# Altium footprint library CONNECTOR.PcbLib: 169 footprints (part 2 of 11)
Each footprint in its own frame and in the unit in brackets; x right, y up, seen from the top. Pads: shape width x height; smd on the part's side, far side on the other; paste and mask are expansions set on the pad; w line width, h text height; cw(c..) or ccw(c..) is an arc to the next point about the centre after c.
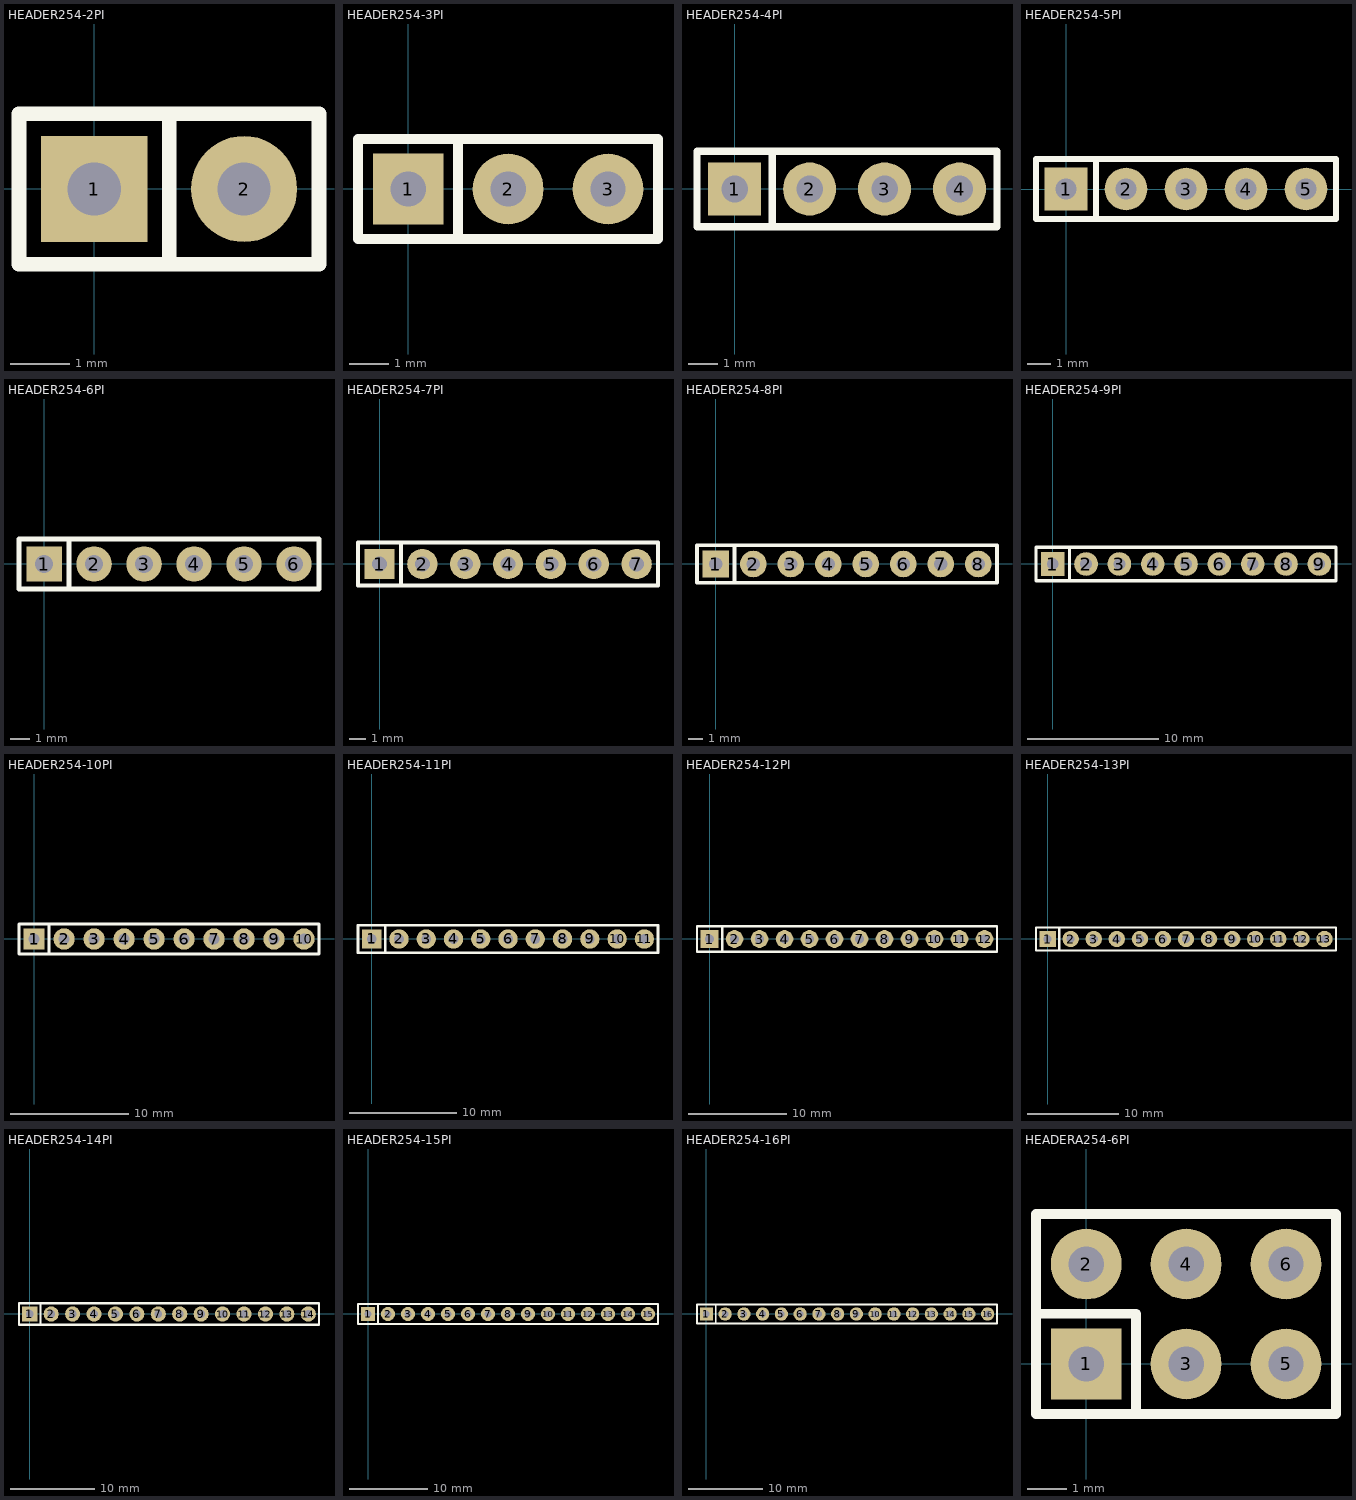
[diagram p1: the footprints below, top view; thin cyan lines are the x and y axes]

## HEADER254-2PI [mm]
pads (2):
  rect 1.8x1.8 hole 0.9: 1(-0.001,0)
  round 1.8 hole 0.9: 2(2.539,0)
Top Overlay:
  lines w0.25: 1.269,-1.275 1.269,1.275 ; -1.276,-1.275 -1.276,1.275 3.81,1.275 3.81,-1.275 -1.276,-1.275
3D body "SIP2.STEP": height 8.64, standoff -3, extent -1.27,-1.27 3.81,1.27

## HEADER254-3PI [mm]
pads (3):
  rect 1.8x1.8 hole 0.9: 1(-0.001,0)
  round 1.8 hole 0.9: 2(2.539,0) 3(5.079,0)
Top Overlay:
  lines w0.25: 1.269,-1.275 1.269,1.275 ; -1.276,-1.275 6.35,-1.275 6.35,1.275 -1.276,1.275 -1.276,-1.275
3D body "SIP2.STEP": height 8.64, standoff -3, extent -1.261,-1.27 3.819,1.27
3D body "SIP2.STEP": height 8.64, standoff -3, extent 1.279,-1.27 6.359,1.27

## HEADER254-4PI [mm]
pads (4):
  rect 1.8x1.8 hole 0.9: 1(-0.001,0)
  round 1.8 hole 0.9: 2(2.539,0) 3(5.079,0) 4(7.619,0)
Top Overlay:
  lines w0.25: 1.269,-1.275 1.269,1.275 ; -1.276,-1.275 -1.276,1.275 8.89,1.275 8.89,-1.275 -1.276,-1.275
3D body "SIP2.STEP": height 8.64, standoff -3, extent 3.799,-1.271 8.879,1.269
3D body "SIP2.STEP": height 8.64, standoff -3, extent -1.281,-1.271 3.799,1.269

## HEADER254-5PI [mm]
pads (5):
  rect 1.8x1.8 hole 0.9: 1(0,0)
  round 1.8 hole 0.9: 2(2.54,0) 3(5.08,0) 4(7.62,0) 5(10.16,0)
Top Overlay:
  lines w0.25: 1.269,-1.27 1.269,1.27 ; -1.27,-1.27 11.43,-1.27 11.43,1.27 -1.27,1.27 -1.27,-1.27
3D body "SIP2.STEP": height 8.64, standoff -3, extent -1.28,-1.27 3.8,1.27
3D body "SIP2.STEP": height 8.64, standoff -3, extent 3.8,-1.27 8.88,1.27
3D body "SIP2.STEP": height 8.64, standoff -3, extent 6.34,-1.27 11.42,1.27

## HEADER254-6PI [mm]
pads (6):
  rect 1.8x1.8 hole 0.9: 1(-0.001,0)
  round 1.8 hole 0.9: 2(2.539,0) 3(5.079,0) 4(7.619,0) 5(10.159,0) 6(12.699,0)
Top Overlay:
  lines w0.25: 1.269,-1.275 1.269,1.275 ; -1.276,-1.275 13.97,-1.275 13.97,1.275 -1.276,1.275 -1.276,-1.275
3D body "SIP2.STEP": height 8.64, standoff -3, extent -1.281,-1.271 3.799,1.269
3D body "SIP2.STEP": height 8.64, standoff -3, extent 3.799,-1.271 8.879,1.269
3D body "SIP2.STEP": height 8.64, standoff -3, extent 8.879,-1.271 13.959,1.269

## HEADER254-7PI [mm]
pads (7):
  rect 1.8x1.8 hole 0.9: 1(0,0)
  round 1.8 hole 0.9: 2(2.54,0) 3(5.08,0) 4(7.62,0) 5(10.16,0) 6(12.7,0) 7(15.24,0)
Top Overlay:
  lines w0.25: 1.27,-1.275 1.27,1.275 ; -1.275,-1.275 -1.275,1.275 16.51,1.275 16.51,-1.275 -1.275,-1.275
3D body "SIP2.STEP": height 8.64, standoff -3, extent 11.42,-1.271 16.5,1.269
3D body "SIP2.STEP": height 8.64, standoff -3, extent -1.28,-1.271 3.8,1.269
3D body "SIP2.STEP": height 8.64, standoff -3, extent 3.8,-1.271 8.88,1.269
3D body "SIP2.STEP": height 8.64, standoff -3, extent 8.88,-1.271 13.96,1.269

## HEADER254-8PI [mm]
pads (8):
  rect 1.8x1.8 hole 0.9: 1(0,0)
  round 1.8 hole 0.9: 2(2.54,0) 3(5.08,0) 4(7.62,0) 5(10.16,0) 6(12.7,0) 7(15.24,0) 8(17.78,0)
Top Overlay:
  lines w0.25: 1.27,-1.275 1.27,1.275 ; -1.275,-1.275 19.05,-1.275 19.05,1.275 -1.275,1.275 -1.275,-1.275
3D body "SIP2.STEP": height 8.64, standoff -3, extent 13.96,-1.271 19.04,1.269
3D body "SIP2.STEP": height 8.64, standoff -3, extent 8.88,-1.271 13.96,1.269
3D body "SIP2.STEP": height 8.64, standoff -3, extent 3.8,-1.271 8.88,1.269
3D body "SIP2.STEP": height 8.64, standoff -3, extent -1.28,-1.271 3.8,1.269

## HEADER254-9PI [mm]
pads (9):
  rect 1.8x1.8 hole 0.9: 1(0,0)
  round 1.8 hole 0.9: 2(2.54,0) 3(5.08,0) 4(7.62,0) 5(10.16,0) 6(12.7,0) 7(15.24,0) 8(17.78,0) 9(20.32,0)
Top Overlay:
  lines w0.25: 1.27,-1.275 1.27,1.275 ; -1.275,-1.275 -1.275,1.275 21.59,1.275 21.59,-1.275 -1.275,-1.275
3D body "SIP2.STEP": height 8.64, standoff -3, extent 16.5,-1.271 21.58,1.269
3D body "SIP2.STEP": height 8.64, standoff -3, extent -1.28,-1.271 3.8,1.269
3D body "SIP2.STEP": height 8.64, standoff -3, extent 3.8,-1.271 8.88,1.269
3D body "SIP2.STEP": height 8.64, standoff -3, extent 8.88,-1.271 13.96,1.269
3D body "SIP2.STEP": height 8.64, standoff -3, extent 13.96,-1.271 19.04,1.269

## HEADER254-10PI [mm]
pads (10):
  rect 1.8x1.8 hole 0.9: 1(0,0)
  round 1.8 hole 0.9: 2(2.54,0) 3(5.08,0) 4(7.62,0) 5(10.16,0) 6(12.7,0) 7(15.24,0) 8(17.78,0) 9(20.32,0) 10(22.86,0)
Top Overlay:
  lines w0.25: 1.27,-1.275 1.27,1.275 ; -1.275,-1.275 -1.275,1.275 24.13,1.275 24.13,-1.275 -1.275,-1.275
3D body "SIP2.STEP": height 8.64, standoff -3, extent -1.28,-1.271 3.8,1.269
3D body "SIP2.STEP": height 8.64, standoff -3, extent 3.8,-1.271 8.88,1.269
3D body "SIP2.STEP": height 8.64, standoff -3, extent 8.88,-1.271 13.96,1.269
3D body "SIP2.STEP": height 8.64, standoff -3, extent 13.96,-1.271 19.04,1.269
3D body "SIP2.STEP": height 8.64, standoff -3, extent 19.04,-1.271 24.12,1.269

## HEADER254-11PI [mm]
pads (11):
  rect 1.8x1.8 hole 0.9: 1(0,0)
  round 1.8 hole 0.9: 2(2.54,0) 3(5.08,0) 4(7.62,0) 5(10.16,0) 6(12.7,0) 7(15.24,0) 8(17.78,0) 9(20.32,0) 10(22.86,0) 11(25.4,0)
Top Overlay:
  lines w0.25: 1.27,-1.275 1.27,1.275 ; -1.275,-1.275 26.67,-1.275 26.67,1.275 -1.275,1.275 -1.275,-1.275
3D body "SIP2.STEP": height 8.64, standoff -3, extent 19.04,-1.271 24.12,1.269
3D body "SIP2.STEP": height 8.64, standoff -3, extent 13.96,-1.271 19.04,1.269
3D body "SIP2.STEP": height 8.64, standoff -3, extent 8.88,-1.271 13.96,1.269
3D body "SIP2.STEP": height 8.64, standoff -3, extent 3.8,-1.271 8.88,1.269
3D body "SIP2.STEP": height 8.64, standoff -3, extent -1.28,-1.271 3.8,1.269
3D body "SIP2.STEP": height 8.64, standoff -3, extent 21.6,-1.27 26.68,1.27

## HEADER254-12PI [mm]
pads (12):
  rect 1.8x1.8 hole 0.9: 1(0,0)
  round 1.8 hole 0.9: 2(2.54,0) 3(5.08,0) 4(7.62,0) 5(10.16,0) 6(12.7,0) 7(15.24,0) 8(17.78,0) 9(20.32,0) 10(22.86,0) 11(25.4,0) 12(27.94,0)
Top Overlay:
  lines w0.25: 1.27,-1.275 1.27,1.275 ; -1.275,-1.275 -1.275,1.275 29.21,1.275 29.21,-1.275 -1.275,-1.275
3D body "SIP2.STEP": height 8.64, standoff -3, extent -1.28,-1.271 3.8,1.269
3D body "SIP2.STEP": height 8.64, standoff -3, extent 3.8,-1.271 8.88,1.269
3D body "SIP2.STEP": height 8.64, standoff -3, extent 8.88,-1.271 13.96,1.269
3D body "SIP2.STEP": height 8.64, standoff -3, extent 13.96,-1.271 19.04,1.269
3D body "SIP2.STEP": height 8.64, standoff -3, extent 19.04,-1.271 24.12,1.269
3D body "SIP2.STEP": height 8.64, standoff -3, extent 24.12,-1.271 29.2,1.269

## HEADER254-13PI [mm]
pads (13):
  rect 1.8x1.8 hole 0.9: 1(0,0)
  round 1.8 hole 0.9: 2(2.54,0) 3(5.08,0) 4(7.62,0) 5(10.16,0) 6(12.7,0) 7(15.24,0) 8(17.78,0) 9(20.32,0) 10(22.86,0) 11(25.4,0) 12(27.94,0) 13(30.48,0)
Top Overlay:
  lines w0.25: 1.27,-1.275 1.27,1.275 ; -1.275,-1.275 -1.275,1.275 31.75,1.275 31.75,-1.275 -1.275,-1.275
3D body "SIP2.STEP": height 8.64, standoff -3, extent -1.28,-1.271 3.8,1.269
3D body "SIP2.STEP": height 8.64, standoff -3, extent 3.8,-1.271 8.88,1.269
3D body "SIP2.STEP": height 8.64, standoff -3, extent 8.88,-1.271 13.96,1.269
3D body "SIP2.STEP": height 8.64, standoff -3, extent 13.96,-1.271 19.04,1.269
3D body "SIP2.STEP": height 8.64, standoff -3, extent 19.04,-1.271 24.12,1.269
3D body "SIP2.STEP": height 8.64, standoff -3, extent 24.12,-1.271 29.2,1.269
3D body "SIP2.STEP": height 8.64, standoff -3, extent 26.66,-1.271 31.74,1.269

## HEADER254-14PI [mm]
pads (14):
  rect 1.8x1.8 hole 0.9: 1(0,0)
  round 1.8 hole 0.9: 2(2.54,0) 3(5.08,0) 4(7.62,0) 5(10.16,0) 6(12.7,0) 7(15.24,0) 8(17.78,0) 9(20.32,0) 10(22.86,0) 11(25.4,0) 12(27.94,0) 13(30.48,0) 14(33.02,0)
Top Overlay:
  lines w0.25: 1.27,-1.275 1.27,1.275 ; -1.275,-1.275 -1.275,1.275 34.29,1.275 34.29,-1.275 -1.275,-1.275
3D body "SIP2.STEP": height 8.64, standoff -3, extent -1.28,-1.271 3.8,1.269
3D body "SIP2.STEP": height 8.64, standoff -3, extent 3.8,-1.271 8.88,1.269
3D body "SIP2.STEP": height 8.64, standoff -3, extent 8.88,-1.271 13.96,1.269
3D body "SIP2.STEP": height 8.64, standoff -3, extent 13.96,-1.271 19.04,1.269
3D body "SIP2.STEP": height 8.64, standoff -3, extent 19.04,-1.271 24.12,1.269
3D body "SIP2.STEP": height 8.64, standoff -3, extent 24.12,-1.271 29.2,1.269
3D body "SIP2.STEP": height 8.64, standoff -3, extent 29.2,-1.271 34.28,1.269

## HEADER254-15PI [mm]
pads (15):
  rect 1.8x1.8 hole 0.9: 1(0,0)
  round 1.8 hole 0.9: 2(2.54,0) 3(5.08,0) 4(7.62,0) 5(10.16,0) 6(12.7,0) 7(15.24,0) 8(17.78,0) 9(20.32,0) 10(22.86,0) 11(25.4,0) 12(27.94,0) 13(30.48,0) 14(33.02,0) 15(35.56,0)
Top Overlay:
  lines w0.25: 1.27,-1.275 1.27,1.275 ; -1.275,-1.275 36.83,-1.275 36.83,1.275 -1.275,1.275 -1.275,-1.275
3D body "SIP2.STEP": height 8.64, standoff -3, extent 31.74,-1.271 36.82,1.269
3D body "SIP2.STEP": height 8.64, standoff -3, extent -1.28,-1.271 3.8,1.269
3D body "SIP2.STEP": height 8.64, standoff -3, extent 3.8,-1.271 8.88,1.269
3D body "SIP2.STEP": height 8.64, standoff -3, extent 8.88,-1.271 13.96,1.269
3D body "SIP2.STEP": height 8.64, standoff -3, extent 13.96,-1.271 19.04,1.269
3D body "SIP2.STEP": height 8.64, standoff -3, extent 19.04,-1.271 24.12,1.269
3D body "SIP2.STEP": height 8.64, standoff -3, extent 24.12,-1.271 29.2,1.269
3D body "SIP2.STEP": height 8.64, standoff -3, extent 29.2,-1.271 34.28,1.269

## HEADER254-16PI [mm]
pads (16):
  rect 1.8x1.8 hole 0.9: 1(0,0)
  round 1.8 hole 0.9: 2(2.54,0) 3(5.08,0) 4(7.62,0) 5(10.16,0) 6(12.7,0) 7(15.24,0) 8(17.78,0) 9(20.32,0) 10(22.86,0) 11(25.4,0) 12(27.94,0) 13(30.48,0) 14(33.02,0) 15(35.56,0) 16(38.1,0)
Top Overlay:
  lines w0.25: 1.27,-1.275 1.27,1.275 ; -1.275,-1.275 -1.275,1.275 39.37,1.275 39.37,-1.275 -1.275,-1.275
3D body "SIP2.STEP": height 8.64, standoff -3, extent 34.28,-1.271 39.36,1.269
3D body "SIP2.STEP": height 8.64, standoff -3, extent 29.2,-1.271 34.28,1.269
3D body "SIP2.STEP": height 8.64, standoff -3, extent 24.12,-1.271 29.2,1.269
3D body "SIP2.STEP": height 8.64, standoff -3, extent 19.04,-1.271 24.12,1.269
3D body "SIP2.STEP": height 8.64, standoff -3, extent 13.96,-1.271 19.04,1.269
3D body "SIP2.STEP": height 8.64, standoff -3, extent 8.88,-1.271 13.96,1.269
3D body "SIP2.STEP": height 8.64, standoff -3, extent 3.8,-1.271 8.88,1.269
3D body "SIP2.STEP": height 8.64, standoff -3, extent -1.28,-1.271 3.8,1.269

## HEADERA254-6PI [mm]
pads (6):
  rect 1.8x1.8 hole 0.9: 1(-0.001,0)
  round 1.8 hole 0.9: 2(-0.001,2.539) 3(2.54,0) 4(2.54,2.54) 5(5.08,0) 6(5.08,2.54)
Top Overlay:
  lines w0.25: -1.268,1.275 1.269,1.275 1.269,-1.27 ; -1.276,-1.27 -1.276,3.81 6.35,3.81 6.35,-1.27 -1.276,-1.27
3D body "SIP2.STEP": height 8.64, standoff -3, extent -1.271,-1.261 1.269,3.819
3D body "SIP2.STEP": height 8.64, standoff -3, extent 1.27,-1.26 3.81,3.82
3D body "SIP2.STEP": height 8.64, standoff -3, extent 3.81,-1.26 6.35,3.82